# Altium footprint library SMT.PcbLib: 325 footprints (part 2 of 21)
Each footprint in its own frame and in the unit in brackets; x right, y up, seen from the top. Pads: shape width x height; smd on the part's side, far side on the other; paste and mask are expansions set on the pad; w line width, h text height; cw(c..) or ccw(c..) is an arc to the next point about the centre after c.
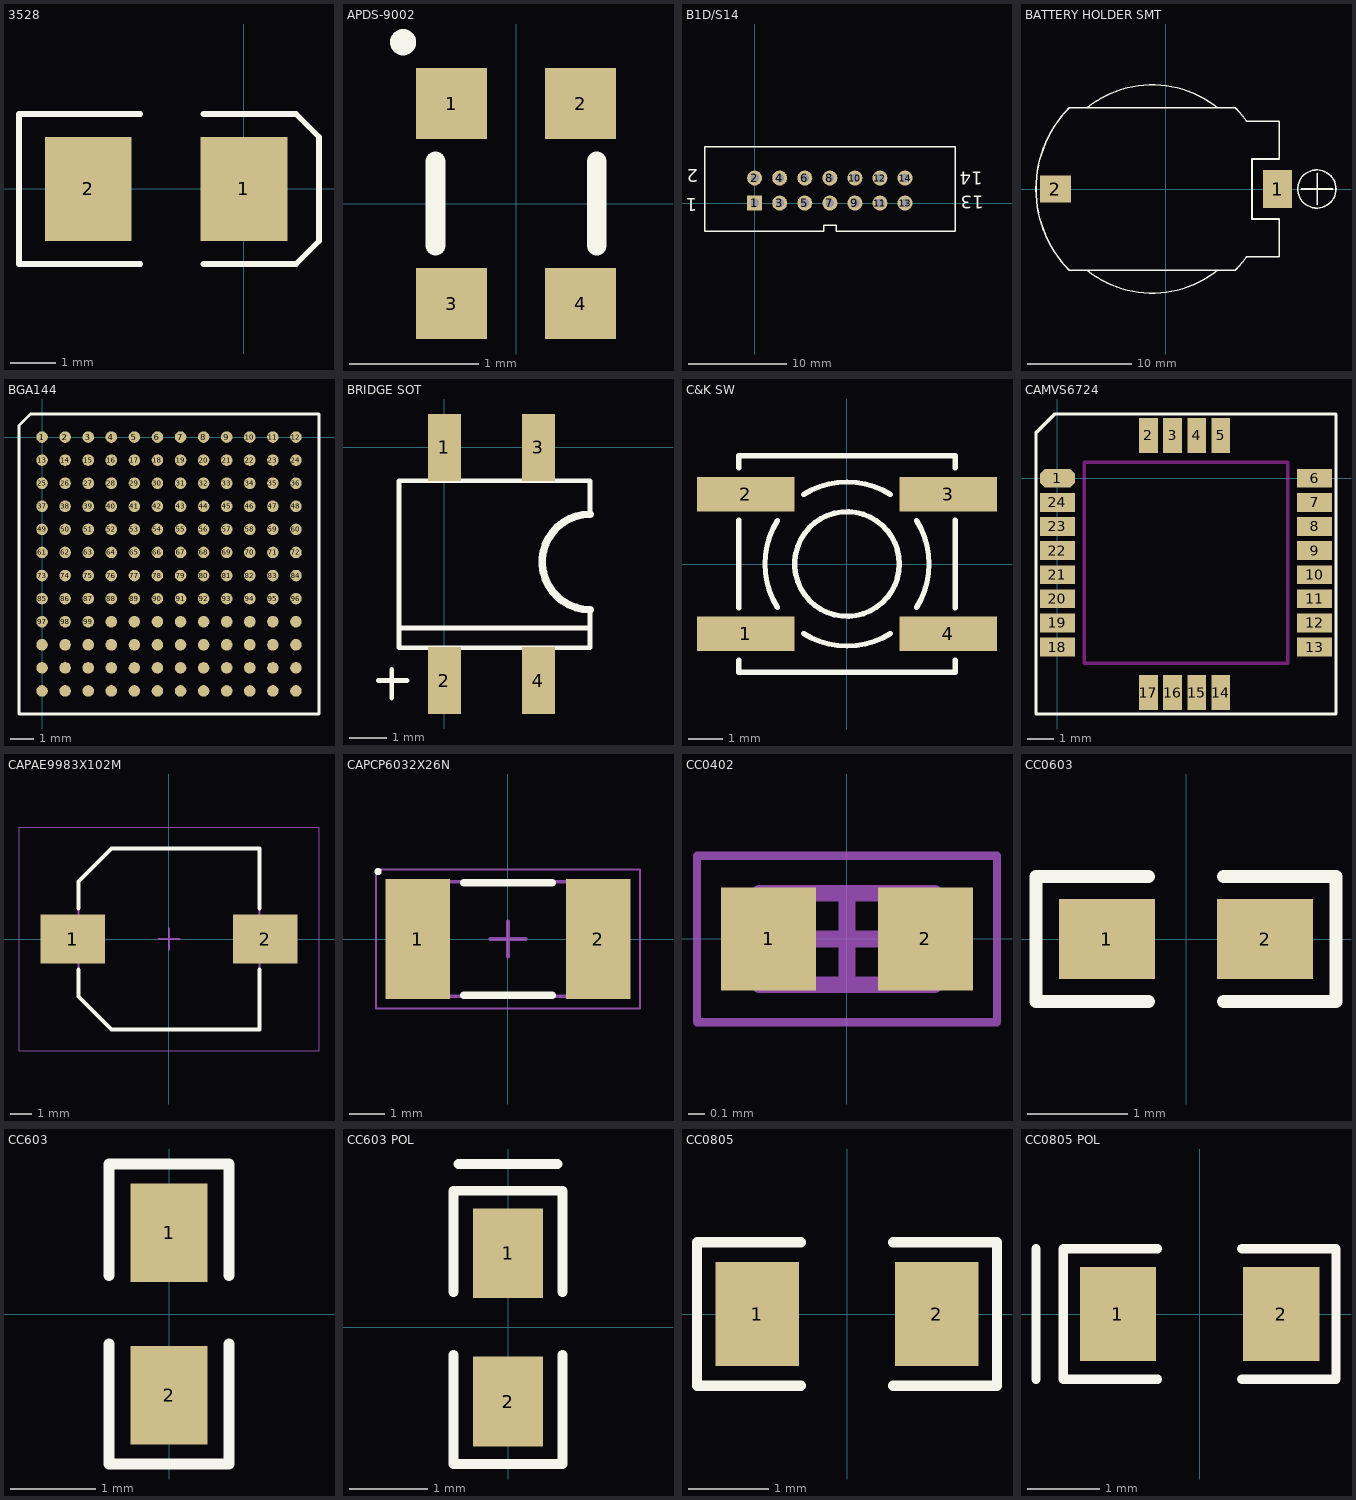
[diagram p1: the footprints below, top view; thin cyan lines are the x and y axes]

## 3528 [mil]
pads (2):
  rect 75x90 smd: 1(0,0) 2(-135,0)
TopOverlay:
  lines w5: -90,-65 -195,-65 -195,65 -90,65 ; -35,-65 45,-65 65,-45 65,45 45,65 -35,65

## APDS-9002 [mm] "4 PIN PHOTO TRANSISTOR"
height 0.8
pads (4):
  rect 0.55x0.55 smd: 1(-0.5,0.775) 2(0.5,0.775) 3(-0.5,-0.775) 4(0.5,-0.775)
TopOverlay:
  circle w0.152: c-0.875,1.25 r0.025
  lines w0.152: -0.625,-0.325 -0.625,0.325 ; 0.625,-0.325 0.625,0.325

## B1D/S14 [mil]
pads (14):
  rect 60x60 hole 35: 1(0,0)
  round 60 hole 35: 2(0,100) 3(100,0) 4(100,100) 5(200,0) 6(200,100) 7(300,0) 8(300,100) 9(400,0) 10(400,100) 11(500,0) 12(500,100) 13(600,0) 14(600,100)
TopOverlay:
  lines w5: -200,-112.5 275,-112.5 275,-87.5 325,-87.5 325,-112 800,-112.5 ; -200,-112 -200,225 800,225 800,-112
  text "14" at 910,125 h52
  text "13" at 915,30 h52
  text "1" at -230,20 h52
  text "2" at -225,135 h52

## BATTERY HOLDER SMT [mm] "CH7410-2032LF"
height 5.3
pads (2):
  rect 2.8x3.6 smd: 1(10.7,0)
  rect 3x2.6 smd: 2(-10.6,0)
TopOverlay:
  circle w0.152: c14.478,0 r1.833
  lines w0.152: -7.564,-7.811 ccw(c-1.32,0) 4.932,-7.805 ; -7.564,7.811 cw(c-1.32,0) 4.932,7.805 ; 6.651,-7.796 ccw(c-1.32,0) 7.724,-6.521 ; 6.651,7.796 cw(c-1.32,0) 7.724,6.521 ; 6.659,-7.796 -1.316,-7.796 -9.291,-7.796 cw(c-1.32,0) -9.291,7.796 -1.316,7.796 6.659,7.796 ; 7.724,-6.5 10.875,-6.5 10.875,-2.875 8.25,-2.875 8.25,0 8.25,2.875 10.875,2.875 10.875,6.5 7.724,6.5 ; 13,0 16,0 ; 14.5,-1.5 14.5,1.5

## BGA144 [mm]
pads (144):
  round 0.5 smd: 1(0,0) 2(1,0) 3(2,0) 4(3,0) 5(4,0) 6(5,0) 7(6,0) 8(7,0) 9(8,0) 10(9,0) 11(10,0) 12(11,0) 13(0,-1) 14(1,-1) 15(2,-1) 16(3,-1) 17(4,-1) 18(5,-1) 19(6,-1) 20(7,-1) 21(8,-1) 22(9,-1) 23(10,-1) 24(11,-1) 25(0,-2) 26(1,-2) 27(2,-2) 28(3,-2) 29(4,-2) 30(5,-2) 31(6,-2) 32(7,-2) 33(8,-2) 34(9,-2) 35(10,-2) 36(11,-2) 37(0,-3) 38(1,-3) 39(2,-3) 40(3,-3) 41(4,-3) 42(5,-3) 43(6,-3) 44(7,-3) 45(8,-3) 46(9,-3) 47(10,-3) 48(11,-3) 49(0,-4) 50(1,-4) 51(2,-4) 52(3,-4) 53(4,-4) 54(5,-4) 55(6,-4) 56(7,-4) 57(8,-4) 58(9,-4) 59(10,-4) 60(11,-4) 61(0,-5) 62(1,-5) 63(2,-5) 64(3,-5) 65(4,-5) 66(5,-5) 67(6,-5) 68(7,-5) 69(8,-5) 70(9,-5) 71(10,-5) 72(11,-5) 73(0,-6) 74(1,-6) 75(2,-6) 76(3,-6) 77(4,-6) 78(5,-6) 79(6,-6) 80(7,-6) 81(8,-6) 82(9,-6) 83(10,-6) 84(11,-6) 85(0,-7) 86(1,-7) 87(2,-7) 88(3,-7) 89(4,-7) 90(5,-7) 91(6,-7) 92(7,-7) 93(8,-7) 94(9,-7) 95(10,-7) 96(11,-7) 97(0,-8) 98(1,-8) 99(2,-8) 100(3,-8) 101(4,-8) 102(5,-8) 103(6,-8) 104(7,-8) 105(8,-8) 106(9,-8) 107(10,-8) 108(11,-8) 109(0,-9) 110(1,-9) 111(2,-9) 112(3,-9) 113(4,-9) 114(5,-9) 115(6,-9) 116(7,-9) 117(8,-9) 118(9,-9) 119(10,-9) 120(11,-9) 121(0,-10) 122(1,-10) 123(2,-10) 124(3,-10) 125(4,-10) 126(5,-10) 127(6,-10) 128(7,-10) 129(8,-10) 130(9,-10) 131(10,-10) 132(11,-10) 133(0,-11) 134(1,-11) 135(2,-11) 136(3,-11) 137(4,-11) 138(5,-11) 139(6,-11) 140(7,-11) 141(8,-11) 142(9,-11) 143(10,-11) 144(11,-11)
TopOverlay:
  lines w0.127: -1,-12 12,-12 12,1 -0.5,1 -1,0.5 -1,-12

## BRIDGE SOT [mil]
pads (4):
  rect 35x70 smd: 1(0,0) 2(0,-244.09) 3(98.42,0) 4(98.42,-244.09)
TopOverlay:
  lines w5: -69.37,-244.09 -39.37,-244.09 ; -55.12,-262.28 -55.12,-232.28 ; -47.64,-188.98 149.21,-188.98 ; 152.36,-169.84 152.36,-209.84 -47.64,-209.84 -47.64,-34.84 152.36,-34.84 152.36,-69.84
  lines w8: 152.36,-169.84 cw(c152.36,-119.84) 152.36,-69.84

## C&K SW [mm] "KSC9 SERIES"
height 7.7
pads (4):
  rect 2.8x1 smd: 1(-2.9,-2) 2(-2.9,2) 3(2.9,2) 4(2.9,-2)
TopOverlay:
  circle w0.152: c0,0 r1.5
  lines w0.152: -3.1,-2.75 -3.1,-3.1 0,-3.1 3.1,-3.1 3.1,-2.75 ; -3.1,-1.25 -3.1,1.25 ; -3.1,2.75 -3.1,3.1 0,3.1 3.1,3.1 3.1,2.75 ; -1.993,-1.245 cw(c0,0) -1.993,1.245 ; -1.245,-1.993 ccw(c0,0) 1.245,-1.993 ; -1.245,1.993 cw(c0,0) 1.245,1.993 ; 1.993,-1.245 ccw(c0,0) 1.993,1.245 ; 3.1,-1.25 3.1,1.25
3D body: height 2.8, standoff 0, extent -3.1,-3.1 3.1,3.1
3D body: height 2.9, standoff 2.8, extent -2.875,-2.875 2.875,2.875
3D body: height 4.5, standoff 2.9, extent -2.45,-2.447 2.45,2.447
3D body: height 7.7, standoff 4.5, extent -1.463,-1.472 1.475,1.472

## CAMVS6724 [mm]
pads (24):
  oct 1.3x0.7 smd: 1(0,0)
  rect 0.7x1.3 smd: 2(3.4,1.6) 3(4.3,1.6) 4(5.2,1.6) 5(6.1,1.6) 14(6.1,-8) 15(5.2,-8) 16(4.3,-8) 17(3.4,-8)
  rect 1.3x0.7 smd: 6(9.6,0) 7(9.6,-0.9) 8(9.6,-1.8) 9(9.6,-2.7) 10(9.6,-3.6) 11(9.6,-4.5) 12(9.6,-5.4) 13(9.6,-6.3) 18(0,-6.3) 19(0,-5.4) 20(0,-4.5) 21(0,-3.6) 22(0,-2.7) 23(0,-1.8) 24(0,-0.9)
TopOverlay:
  lines w0.127: -0.8,-8.8 10.4,-8.8 10.4,2.4 -0.1,2.4 -0.8,1.7 -0.8,-8.8
KeepOutLayer:
  lines w0.127: 1,-6.9 8.6,-6.9 8.6,0.6 1,0.6 1,-6.9

## CAPAE9983X102M [mm] "Aluminum Electrolytic Capacitor, Body 8.30x8.30x10.20mm, IPC Low Density"
height 10.2
pads (2):
  rect 3.05x2.3 smd: 1(-4.525,0) 2(4.525,0)
TopOverlay:
  lines w0.2: -4.25,-1.45 -4.25,-2.7 -2.7,-4.25 4.25,-4.25 4.25,-1.45 ; -4.25,1.45 -4.25,2.7 -2.7,4.25 4.25,4.25 4.25,1.45
Mechanical13:
  lines w0.1: -4.25,-2.7 -2.7,-4.25 4.25,-4.25 4.25,4.25 -2.7,4.25 -4.25,2.7 -4.25,-2.7
Mechanical15:
  lines w0.05: -7.05,-5.25 -7.05,5.25 7.05,5.25 7.05,-5.25 -7.05,-5.25
  lines w0.1: -0.5,0 0.5,0 ; 0,-0.5 0,0.5
3D body: height 3.4, standoff 0, extent -4.25,-4.25 4.25,4.25
3D body: height 10.2, standoff 0, extent -4.25,-4.25 4.25,4.25

## CAPCP6032X26N [mm] "Chip Capacitor, 2-Leads, Body 6.00x3.20mm, IPC Medium Density"
height 2.6
pads (2):
  rect 1.8x3.35 smd: 1(-2.525,0) 2(2.525,0)
TopOverlay:
  circle w0.1: c-3.637,1.887 r0.05
  lines w0.2: -1.25,-1.575 1.25,-1.575 ; -1.25,1.575 1.25,1.575
Mechanical13:
  lines w0.1: -3,-1.6 -3,1.6 3,1.6 3,-1.6 -3,-1.6
Mechanical15:
  lines w0.05: -3.7,-1.95 -3.7,1.95 3.7,1.95 3.7,-1.95 -3.7,-1.95
  lines w0.1: -0.5,0 0.5,0 ; 0,-0.5 0,0.5
3D body: height 2.6, standoff 0, extent -1.7,-1.6 1.7,1.6
3D body: height 2.6, standoff 0, extent -3,-1.6 -1.7,1.6
3D body: height 2.6, standoff 0, extent 1.7,-1.6 3,1.6

## CC0402 [mm] "Chip Inductor, 2-Leads, Body 1.00x0.50mm, IPC Medium Density"
height 0.55
pads (2):
  rect 0.57x0.62 smd: 1(-0.47,0) 2(0.47,0)
Mechanical13:
  lines w0.1: -0.525,-0.275 -0.525,0.275 0.525,0.275 0.525,-0.275 -0.525,-0.275
Mechanical15:
  lines w0.05: -0.9,-0.5 -0.9,0.5 0.9,0.5 0.9,-0.5 -0.9,-0.5
  lines w0.1: -0.275,0 0.275,0 ; 0,-0.275 0,0.275
3D body: height 0.55, standoff 0, extent -0.275,-0.275 0.275,0.275
3D body: height 0.55, standoff 0, extent -0.525,-0.275 -0.275,0.275
3D body: height 0.55, standoff 0, extent 0.275,-0.275 0.525,0.275

## CC0603 [mm]
pads (2):
  rect 0.96x0.8 smd: 1(-0.79,0) 2(0.79,0)
TopOverlay:
  lines w0.127: -0.375,-0.625 -1.5,-0.625 -1.5,0.625 -0.375,0.625 ; 0.375,-0.625 1.5,-0.625 1.5,0.625 0.375,0.625
3D body: height 0.45, standoff 0, extent -0.8,-0.4 0.8,0.4

## CC603 [mm]
pads (2):
  rect 0.9x1.15 smd: 1(0,0.95) 2(0,-0.95)
TopOverlay:
  lines w0.127: -0.7,-0.35 -0.7,-1.75 0.7,-1.75 0.7,-0.35 ; -0.7,0.45 -0.7,1.75 0.7,1.75 0.7,0.45

## CC603 POL [mm]
pads (2):
  rect 0.9x1.15 smd: 1(0,0.95) 2(0,-0.95)
TopOverlay:
  lines w0.127: -0.7,-0.35 -0.7,-1.75 0.7,-1.75 0.7,-0.35 ; -0.7,0.45 -0.7,1.75 0.7,1.75 0.7,0.45 ; -0.635,2.093 0.635,2.093

## CC0805 [mm]
pads (2):
  rect 1.05x1.3 smd: 1(-1.125,0) 2(1.125,0)
TopOverlay:
  lines w0.127: -0.58,-0.9 -1.88,-0.9 -1.88,0.9 -0.58,0.9 ; 0.58,-0.9 1.88,-0.9 1.88,0.9 0.58,0.9
3D body: height 1.35, standoff 0, extent -1,-0.675 1,0.675

## CC0805 POL [mm]
pads (2):
  rect 1.05x1.3 smd: 1(-1.125,0) 2(1.125,0)
TopOverlay:
  lines w0.127: -2.255,-0.9 -2.255,0.9 ; -0.58,-0.9 -1.88,-0.9 -1.88,0.9 -0.58,0.9 ; 0.58,-0.9 1.88,-0.9 1.88,0.9 0.58,0.9
3D body: height 1.35, standoff 0, extent -1,-0.675 1,0.675